# Altium integrated library Samtec 2 mm Pitch Terminal Strips.IntLib: 623 symbols (part 2 of 5) (continued)
## T2M-107-01-L-D-TH-WT (continued)
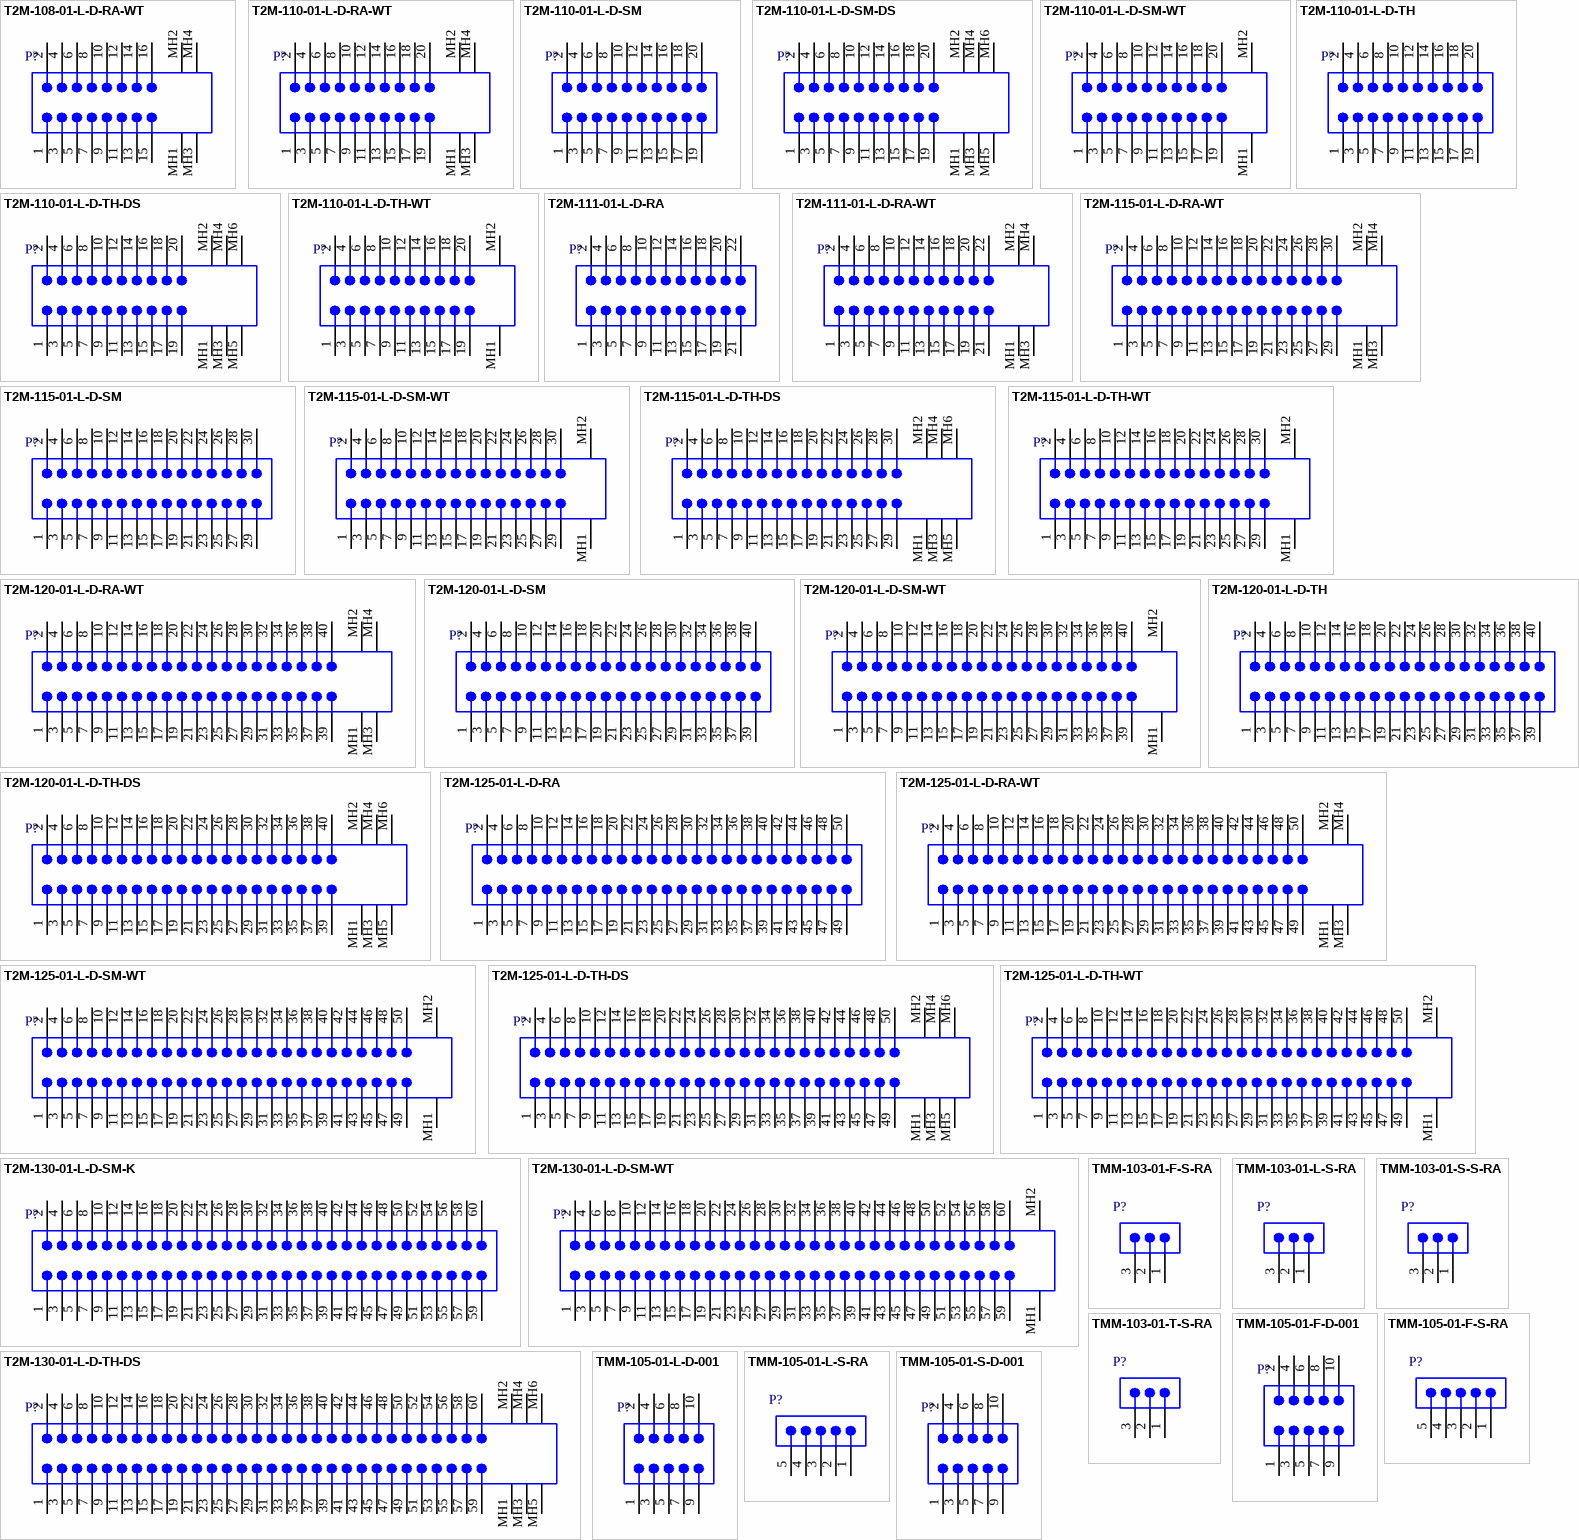
[diagram p5: symbols T2M-108-01-L-D-RA-WT to TMM-105-01-S-D-001]

## T2M-108-01-L-D-RA-WT
designator P?
High Reliability Cable Header, Through-hole, Right Angle, -55 to 125 degC, 2 mm Pitch, 16-Pin, Male, RoHS; Manufacturer: Samtec; PartNumber: T2M-108-01-L-D-RA-WT; Pitch: 2 mm; DatasheetVersion: F-214; PackageVersion: V, 3/2009; PackageReference: T2M-108-01-X-D-RA-WT; PackageDescription: 2mm Shrouded Terminal Strip; Orientation: Right Angle; RoHS: True; Temperature Range: -55 to 125 degC; Mounting Technology: Through-hole; ComponentLink1Description: Manufacturer URL; ComponentLink1URL: http://www.samtec.com; ComponentLink2Description: Datasheet; ComponentLink2URL: http://d2a072wq521u33.cloudfront.net/catalog_english//t2m.pdf; ComponentLink3Description: Package Specification; ComponentLink3URL: http://www.samtec.com/documents/webfiles/cpdf/T2M-1XX-XX-X-D-XX-XX-MKT.pdf
footprint SMTC-T2M-108-01-X-D-RA-WT (Shrouded Terminal Strip, 2x8 Pins, Right Angle, 2mm Pitch, Male)
pins: 1, 2, 3, 4, 5, 6, 7, 8, 9, 10, 11, 12, 13, 14, 15, 16, MH1, MH2, MH3, MH4

## T2M-110-01-L-D-RA-WT
designator P?
High Reliability Cable Header, Through-hole, Right Angle, -55 to 125 degC, 2 mm Pitch, 20-Pin, Male, RoHS; Manufacturer: Samtec; PartNumber: T2M-110-01-L-D-RA-WT; Pitch: 2 mm; DatasheetVersion: F-214; PackageVersion: V, 3/2009; PackageReference: T2M-110-01-X-D-RA-WT; PackageDescription: 2mm Shrouded Terminal Strip; Supplier 1: Newark; Supplier Part Number 1: 92T9484; Orientation: Right Angle; RoHS: True; Temperature Range: -55 to 125 degC; Mounting Technology: Through-hole; ComponentLink1Description: Manufacturer URL; ComponentLink1URL: http://www.samtec.com; ComponentLink2Description: Datasheet; ComponentLink2URL: http://d2a072wq521u33.cloudfront.net/catalog_english//t2m.pdf; ComponentLink3Description: Package Specification; ComponentLink3URL: http://www.samtec.com/documents/webfiles/cpdf/T2M-1XX-XX-X-D-XX-XX-MKT.pdf
footprint SMTC-T2M-110-01-X-D-RA-WT (Shrouded Terminal Strip, 2x10 Pins, Right Angle, 2mm Pitch, Male)
pins: 1, 2, 3, 4, 5, 6, 7, 8, 9, 10, 11, 12, 13, 14, 15, 16, 17, 18, 19, 20, MH1, MH2, MH3, MH4

## T2M-110-01-L-D-SM
designator P?
High Reliability Cable Header, Surface Mount, Vertical, -55 to 125 degC, 2 mm Pitch, 20-Pin, Male, RoHS; Manufacturer: Samtec; PartNumber: T2M-110-01-L-D-SM; Pitch: 2 mm; DatasheetVersion: F-214; PackageVersion: V, 3/2009; PackageReference: T2M-110-01-X-D-SM; PackageDescription: 2mm Shrouded Terminal Strip; Orientation: Vertical; RoHS: True; Temperature Range: -55 to 125 degC; Mounting Technology: Surface Mount; ComponentLink1Description: Manufacturer URL; ComponentLink1URL: http://www.samtec.com; ComponentLink2Description: Datasheet; ComponentLink2URL: http://d2a072wq521u33.cloudfront.net/catalog_english//t2m.pdf; ComponentLink3Description: Package Specification; ComponentLink3URL: http://www.samtec.com/documents/webfiles/cpdf/T2M-1XX-XX-X-D-XX-XX-MKT.pdf
footprint SMTC-T2M-110-01-X-D-SM (Shrouded Terminal Strip, 2x10 Pins, Vertical, 2mm Pitch, Male)
pins: 1, 2, 3, 4, 5, 6, 7, 8, 9, 10, 11, 12, 13, 14, 15, 16, 17, 18, 19, 20

## T2M-110-01-L-D-SM-DS
designator P?
High Reliability Cable Header, Vertical, -55 to 125 degC, 2 mm Pitch, 20-Pin, Male, RoHS; Manufacturer: Samtec; PartNumber: T2M-110-01-L-D-SM-DS; Pitch: 2 mm; DatasheetVersion: F-214; PackageVersion: V, 3/2009; PackageReference: T2M-110-01-X-D-SM-DS; PackageDescription: 2mm Shrouded Terminal Strip; Orientation: Vertical; RoHS: True; Temperature Range: -55 to 125 degC; ComponentLink1Description: Manufacturer URL; ComponentLink1URL: http://www.samtec.com; ComponentLink2Description: Datasheet; ComponentLink2URL: http://d2a072wq521u33.cloudfront.net/catalog_english//t2m.pdf; ComponentLink3Description: Package Specification; ComponentLink3URL: http://www.samtec.com/documents/webfiles/cpdf/T2M-1XX-XX-X-D-XX-XX-MKT.pdf
footprint SMTC-T2M-110-01-X-D-SM-DS (Shrouded Terminal Strip, 2x10 Pins, Vertical, 2mm Pitch, Male)
pins: 1, 2, 3, 4, 5, 6, 7, 8, 9, 10, 11, 12, 13, 14, 15, 16, 17, 18, 19, 20, MH1, MH2, MH3, MH4, MH5, MH6

## T2M-110-01-L-D-SM-WT
designator P?
High Reliability Cable Header, Vertical, -55 to 125 degC, 2 mm Pitch, 20-Pin, Male, RoHS; Manufacturer: Samtec; PartNumber: T2M-110-01-L-D-SM-WT; Pitch: 2 mm; DatasheetVersion: F-214; PackageVersion: V, 3/2009; PackageReference: T2M-110-01-X-D-SM-WT; PackageDescription: 2mm Shrouded Terminal Strip; Orientation: Vertical; RoHS: True; Temperature Range: -55 to 125 degC; ComponentLink1Description: Manufacturer URL; ComponentLink1URL: http://www.samtec.com; ComponentLink2Description: Datasheet; ComponentLink2URL: http://d2a072wq521u33.cloudfront.net/catalog_english//t2m.pdf; ComponentLink3Description: Package Specification; ComponentLink3URL: http://www.samtec.com/documents/webfiles/cpdf/T2M-1XX-XX-X-D-XX-XX-MKT.pdf
footprint SMTC-T2M-110-01-X-D-SM-WT (Shrouded Terminal Strip, 2x10 Pins, Vertical, 2mm Pitch, Male)
pins: 1, 2, 3, 4, 5, 6, 7, 8, 9, 10, 11, 12, 13, 14, 15, 16, 17, 18, 19, 20, MH1, MH2

## T2M-110-01-L-D-TH
designator P?
High Reliability Cable Header, Through-hole, Vertical, -55 to 125 degC, 2 mm Pitch, 20-Pin, Male, RoHS; Manufacturer: Samtec; PartNumber: T2M-110-01-L-D-TH; Pitch: 2 mm; DatasheetVersion: F-214; PackageVersion: V, 3/2009; PackageReference: T2M-110-01-X-D-TH; PackageDescription: 2mm Shrouded Terminal Strip; Orientation: Vertical; RoHS: True; Temperature Range: -55 to 125 degC; Mounting Technology: Through-hole; ComponentLink1Description: Manufacturer URL; ComponentLink1URL: http://www.samtec.com; ComponentLink2Description: Datasheet; ComponentLink2URL: http://d2a072wq521u33.cloudfront.net/catalog_english//t2m.pdf; ComponentLink3Description: Package Specification; ComponentLink3URL: http://www.samtec.com/documents/webfiles/cpdf/T2M-1XX-XX-X-D-XX-XX-MKT.pdf
footprint SMTC-T2M-110-01-X-D-TH (Shrouded Terminal Strip, 2x10 Pins, Vertical, 2mm Pitch, Male)
pins: 1, 2, 3, 4, 5, 6, 7, 8, 9, 10, 11, 12, 13, 14, 15, 16, 17, 18, 19, 20

## T2M-110-01-L-D-TH-DS
designator P?
High Reliability Cable Header, Through-hole, Vertical, -55 to 125 degC, 2 mm Pitch, 20-Pin, Male, RoHS; Manufacturer: Samtec; PartNumber: T2M-110-01-L-D-TH-DS; Pitch: 2 mm; DatasheetVersion: F-214; PackageVersion: V, 3/2009; PackageReference: T2M-110-01-X-D-TH-DS; PackageDescription: 2mm Shrouded Terminal Strip; Orientation: Vertical; RoHS: True; Temperature Range: -55 to 125 degC; Mounting Technology: Through-hole; ComponentLink1Description: Manufacturer URL; ComponentLink1URL: http://www.samtec.com; ComponentLink2Description: Datasheet; ComponentLink2URL: http://d2a072wq521u33.cloudfront.net/catalog_english//t2m.pdf; ComponentLink3Description: Package Specification; ComponentLink3URL: http://www.samtec.com/documents/webfiles/cpdf/T2M-1XX-XX-X-D-XX-XX-MKT.pdf
footprint SMTC-T2M-110-01-X-D-TH-DS (Shrouded Terminal Strip, 2x10 Pins, Vertical, 2mm Pitch, Male)
pins: 1, 2, 3, 4, 5, 6, 7, 8, 9, 10, 11, 12, 13, 14, 15, 16, 17, 18, 19, 20, MH1, MH2, MH3, MH4, MH5, MH6

## T2M-110-01-L-D-TH-WT
designator P?
High Reliability Cable Header, Through-hole, Vertical, -55 to 125 degC, 2 mm Pitch, 20-Pin, Male, RoHS; Manufacturer: Samtec; PartNumber: T2M-110-01-L-D-TH-WT; Pitch: 2 mm; DatasheetVersion: F-214; PackageVersion: V, 3/2009; PackageReference: T2M-110-01-X-D-TH-WT; PackageDescription: 2mm Shrouded Terminal Strip; Orientation: Vertical; RoHS: True; Temperature Range: -55 to 125 degC; Mounting Technology: Through-hole; ComponentLink1Description: Manufacturer URL; ComponentLink1URL: http://www.samtec.com; ComponentLink2Description: Datasheet; ComponentLink2URL: http://d2a072wq521u33.cloudfront.net/catalog_english//t2m.pdf; ComponentLink3Description: Package Specification; ComponentLink3URL: http://www.samtec.com/documents/webfiles/cpdf/T2M-1XX-XX-X-D-XX-XX-MKT.pdf
footprint SMTC-T2M-110-01-X-D-TH-WT (Shrouded Terminal Strip, 2x10 Pins, Vertical, 2mm Pitch, Male)
pins: 1, 2, 3, 4, 5, 6, 7, 8, 9, 10, 11, 12, 13, 14, 15, 16, 17, 18, 19, 20, MH1, MH2

## T2M-111-01-L-D-RA
designator P?
High Reliability Cable Header, Through-hole, Right Angle, -55 to 125 degC, 2 mm Pitch, 22-Pin, Male, RoHS; Manufacturer: Samtec; PartNumber: T2M-111-01-L-D-RA; Pitch: 2 mm; DatasheetVersion: F-214; PackageVersion: V, 3/2009; PackageReference: T2M-111-01-X-D-RA; PackageDescription: 2mm Shrouded Terminal Strip; Orientation: Right Angle; RoHS: True; Temperature Range: -55 to 125 degC; Mounting Technology: Through-hole; ComponentLink1Description: Manufacturer URL; ComponentLink1URL: http://www.samtec.com; ComponentLink2Description: Datasheet; ComponentLink2URL: http://d2a072wq521u33.cloudfront.net/catalog_english//t2m.pdf; ComponentLink3Description: Package Specification; ComponentLink3URL: http://www.samtec.com/documents/webfiles/cpdf/T2M-1XX-XX-X-D-XX-XX-MKT.pdf
footprint SMTC-T2M-111-01-X-D-RA (Shrouded Terminal Strip, 2x11 Pins, Right Angle, 2mm Pitch, Male)
pins: 1, 2, 3, 4, 5, 6, 7, 8, 9, 10, 11, 12, 13, 14, 15, 16, 17, 18, 19, 20, 21, 22

## T2M-111-01-L-D-RA-WT
designator P?
High Reliability Cable Header, Through-hole, Right Angle, -55 to 125 degC, 2 mm Pitch, 22-Pin, Male, RoHS; Manufacturer: Samtec; PartNumber: T2M-111-01-L-D-RA-WT; Pitch: 2 mm; DatasheetVersion: F-214; PackageVersion: V, 3/2009; PackageReference: T2M-111-01-X-D-RA-WT; PackageDescription: 2mm Shrouded Terminal Strip; Orientation: Right Angle; RoHS: True; Temperature Range: -55 to 125 degC; Mounting Technology: Through-hole; ComponentLink1Description: Manufacturer URL; ComponentLink1URL: http://www.samtec.com; ComponentLink2Description: Datasheet; ComponentLink2URL: http://d2a072wq521u33.cloudfront.net/catalog_english//t2m.pdf; ComponentLink3Description: Package Specification; ComponentLink3URL: http://www.samtec.com/documents/webfiles/cpdf/T2M-1XX-XX-X-D-XX-XX-MKT.pdf
footprint SMTC-T2M-111-01-X-D-RA-WT (Shrouded Terminal Strip, 2x11 Pins, Right Angle, 2mm Pitch, Male)
pins: 1, 2, 3, 4, 5, 6, 7, 8, 9, 10, 11, 12, 13, 14, 15, 16, 17, 18, 19, 20, 21, 22, MH1, MH2, MH3, MH4

## T2M-115-01-L-D-RA-WT
designator P?
High Reliability Cable Header, Through-hole, Right Angle, -55 to 125 degC, 2 mm Pitch, 30-Pin, Male, RoHS; Manufacturer: Samtec; PartNumber: T2M-115-01-L-D-RA-WT; Pitch: 2 mm; DatasheetVersion: F-214; PackageVersion: V, 3/2009; PackageReference: T2M-115-01-X-D-RA-WT; PackageDescription: 2mm Shrouded Terminal Strip; Supplier 1: Newark; Supplier Part Number 1: 28T0618; Orientation: Right Angle; RoHS: True; Temperature Range: -55 to 125 degC; Mounting Technology: Through-hole; ComponentLink1Description: Manufacturer URL; ComponentLink1URL: http://www.samtec.com; ComponentLink2Description: Datasheet; ComponentLink2URL: http://d2a072wq521u33.cloudfront.net/catalog_english//t2m.pdf; ComponentLink3Description: Package Specification; ComponentLink3URL: http://www.samtec.com/documents/webfiles/cpdf/T2M-1XX-XX-X-D-XX-XX-MKT.pdf
footprint SMTC-T2M-115-01-X-D-RA-WT (Shrouded Terminal Strip, 2x15 Pins, Right Angle, 2mm Pitch, Male)
pins: 1, 2, 3, 4, 5, 6, 7, 8, 9, 10, 11, 12, 13, 14, 15, 16, 17, 18, 19, 20, 21, 22, 23, 24, 25, 26, 27, 28, 29, 30, MH1, MH2, MH3, MH4

## T2M-115-01-L-D-SM
designator P?
High Reliability Cable Header, Surface Mount, Vertical, -55 to 125 degC, 2 mm Pitch, 30-Pin, Male, RoHS; Manufacturer: Samtec; PartNumber: T2M-115-01-L-D-SM; Pitch: 2 mm; DatasheetVersion: F-214; PackageVersion: V, 3/2009; PackageReference: T2M-115-01-X-D-SM; PackageDescription: 2mm Shrouded Terminal Strip; Orientation: Vertical; RoHS: True; Temperature Range: -55 to 125 degC; Mounting Technology: Surface Mount; ComponentLink1Description: Manufacturer URL; ComponentLink1URL: http://www.samtec.com; ComponentLink2Description: Datasheet; ComponentLink2URL: http://d2a072wq521u33.cloudfront.net/catalog_english//t2m.pdf; ComponentLink3Description: Package Specification; ComponentLink3URL: http://www.samtec.com/documents/webfiles/cpdf/T2M-1XX-XX-X-D-XX-XX-MKT.pdf
footprint SMTC-T2M-115-01-X-D-SM (Shrouded Terminal Strip, 2x15 Pins, Vertical, 2mm Pitch, Male)
pins: 1, 2, 3, 4, 5, 6, 7, 8, 9, 10, 11, 12, 13, 14, 15, 16, 17, 18, 19, 20, 21, 22, 23, 24, 25, 26, 27, 28, 29, 30

## T2M-115-01-L-D-SM-WT
designator P?
High Reliability Cable Header, Vertical, -55 to 125 degC, 2 mm Pitch, 30-Pin, Male, RoHS; Manufacturer: Samtec; PartNumber: T2M-115-01-L-D-SM-WT; Pitch: 2 mm; DatasheetVersion: F-214; PackageVersion: V, 3/2009; PackageReference: T2M-115-01-X-D-SM-WT; PackageDescription: 2mm Shrouded Terminal Strip; Orientation: Vertical; RoHS: True; Temperature Range: -55 to 125 degC; ComponentLink1Description: Manufacturer URL; ComponentLink1URL: http://www.samtec.com; ComponentLink2Description: Datasheet; ComponentLink2URL: http://d2a072wq521u33.cloudfront.net/catalog_english//t2m.pdf; ComponentLink3Description: Package Specification; ComponentLink3URL: http://www.samtec.com/documents/webfiles/cpdf/T2M-1XX-XX-X-D-XX-XX-MKT.pdf
footprint SMTC-T2M-115-01-X-D-SM-WT (Shrouded Terminal Strip, 2x15 Pins, Vertical, 2mm Pitch, Male)
pins: 1, 2, 3, 4, 5, 6, 7, 8, 9, 10, 11, 12, 13, 14, 15, 16, 17, 18, 19, 20, 21, 22, 23, 24, 25, 26, 27, 28, 29, 30, MH1, MH2

## T2M-115-01-L-D-TH-DS
designator P?
High Reliability Cable Header, Through-hole, Vertical, -55 to 125 degC, 2 mm Pitch, 30-Pin, Male, RoHS; Manufacturer: Samtec; PartNumber: T2M-115-01-L-D-TH-DS; Pitch: 2 mm; DatasheetVersion: F-214; PackageVersion: V, 3/2009; PackageReference: T2M-115-01-X-D-TH-DS; PackageDescription: 2mm Shrouded Terminal Strip; Orientation: Vertical; RoHS: True; Temperature Range: -55 to 125 degC; Mounting Technology: Through-hole; ComponentLink1Description: Manufacturer URL; ComponentLink1URL: http://www.samtec.com; ComponentLink2Description: Datasheet; ComponentLink2URL: http://d2a072wq521u33.cloudfront.net/catalog_english//t2m.pdf; ComponentLink3Description: Package Specification; ComponentLink3URL: http://www.samtec.com/documents/webfiles/cpdf/T2M-1XX-XX-X-D-XX-XX-MKT.pdf
footprint SMTC-T2M-115-01-X-D-TH-DS (Shrouded Terminal Strip, 2x15 Pins, Vertical, 2mm Pitch, Male)
pins: 1, 2, 3, 4, 5, 6, 7, 8, 9, 10, 11, 12, 13, 14, 15, 16, 17, 18, 19, 20, 21, 22, 23, 24, 25, 26, 27, 28, 29, 30, MH1, MH2, MH3, MH4, MH5, MH6

## T2M-115-01-L-D-TH-WT
designator P?
High Reliability Cable Header, Through-hole, Vertical, -55 to 125 degC, 2 mm Pitch, 30-Pin, Male, RoHS; Manufacturer: Samtec; PartNumber: T2M-115-01-L-D-TH-WT; Pitch: 2 mm; DatasheetVersion: F-214; PackageVersion: V, 3/2009; PackageReference: T2M-115-01-X-D-TH-WT; PackageDescription: 2mm Shrouded Terminal Strip; Orientation: Vertical; RoHS: True; Temperature Range: -55 to 125 degC; Mounting Technology: Through-hole; ComponentLink1Description: Manufacturer URL; ComponentLink1URL: http://www.samtec.com; ComponentLink2Description: Datasheet; ComponentLink2URL: http://d2a072wq521u33.cloudfront.net/catalog_english//t2m.pdf; ComponentLink3Description: Package Specification; ComponentLink3URL: http://www.samtec.com/documents/webfiles/cpdf/T2M-1XX-XX-X-D-XX-XX-MKT.pdf
footprint SMTC-T2M-115-01-X-D-TH-WT (Shrouded Terminal Strip, 2x15 Pins, Vertical, 2mm Pitch, Male)
pins: 1, 2, 3, 4, 5, 6, 7, 8, 9, 10, 11, 12, 13, 14, 15, 16, 17, 18, 19, 20, 21, 22, 23, 24, 25, 26, 27, 28, 29, 30, MH1, MH2

## T2M-120-01-L-D-RA-WT
designator P?
High Reliability Cable Header, Through-hole, Right Angle, -55 to 125 degC, 2 mm Pitch, 40-Pin, Male, RoHS; Manufacturer: Samtec; PartNumber: T2M-120-01-L-D-RA-WT; Pitch: 2 mm; DatasheetVersion: F-214; PackageVersion: V, 3/2009; PackageReference: T2M-120-01-X-D-RA-WT; PackageDescription: 2mm Shrouded Terminal Strip; Orientation: Right Angle; RoHS: True; Temperature Range: -55 to 125 degC; Mounting Technology: Through-hole; ComponentLink1Description: Manufacturer URL; ComponentLink1URL: http://www.samtec.com; ComponentLink2Description: Datasheet; ComponentLink2URL: http://d2a072wq521u33.cloudfront.net/catalog_english//t2m.pdf; ComponentLink3Description: Package Specification; ComponentLink3URL: http://www.samtec.com/documents/webfiles/cpdf/T2M-1XX-XX-X-D-XX-XX-MKT.pdf
footprint SMTC-T2M-120-01-X-D-RA-WT (Shrouded Terminal Strip, 2x20 Pins, Right Angle, 2mm Pitch, Male)
pins: 1, 2, 3, 4, 5, 6, 7, 8, 9, 10, 11, 12, 13, 14, 15, 16, 17, 18, 19, 20, 21, 22, 23, 24, 25, 26, 27, 28, 29, 30, 31, 32, 33, 34, 35, 36, 37, 38, 39, 40, MH1, MH2, MH3, MH4

## T2M-120-01-L-D-SM
designator P?
High Reliability Cable Header, Surface Mount, Vertical, -55 to 125 degC, 2 mm Pitch, 40-Pin, Male, RoHS; Manufacturer: Samtec; PartNumber: T2M-120-01-L-D-SM; Pitch: 2 mm; DatasheetVersion: F-214; PackageVersion: V, 3/2009; PackageReference: T2M-120-01-X-D-SM; PackageDescription: 2mm Shrouded Terminal Strip; Orientation: Vertical; RoHS: True; Temperature Range: -55 to 125 degC; Mounting Technology: Surface Mount; ComponentLink1Description: Manufacturer URL; ComponentLink1URL: http://www.samtec.com; ComponentLink2Description: Datasheet; ComponentLink2URL: http://d2a072wq521u33.cloudfront.net/catalog_english//t2m.pdf; ComponentLink3Description: Package Specification; ComponentLink3URL: http://www.samtec.com/documents/webfiles/cpdf/T2M-1XX-XX-X-D-XX-XX-MKT.pdf
footprint SMTC-T2M-120-01-X-D-SM (Shrouded Terminal Strip, 2x20 Pins, Vertical, 2mm Pitch, Male)
pins: 1, 2, 3, 4, 5, 6, 7, 8, 9, 10, 11, 12, 13, 14, 15, 16, 17, 18, 19, 20, 21, 22, 23, 24, 25, 26, 27, 28, 29, 30, 31, 32, 33, 34, 35, 36, 37, 38, 39, 40

## T2M-120-01-L-D-SM-WT
designator P?
High Reliability Cable Header, Vertical, -55 to 125 degC, 2 mm Pitch, 40-Pin, Male, RoHS; Manufacturer: Samtec; PartNumber: T2M-120-01-L-D-SM-WT; Pitch: 2 mm; DatasheetVersion: F-214; PackageVersion: V, 3/2009; PackageReference: T2M-120-01-X-D-SM-WT; PackageDescription: 2mm Shrouded Terminal Strip; Supplier 1: Newark; Supplier Part Number 1: 43T4685; Orientation: Vertical; RoHS: True; Temperature Range: -55 to 125 degC; ComponentLink1Description: Manufacturer URL; ComponentLink1URL: http://www.samtec.com; ComponentLink2Description: Datasheet; ComponentLink2URL: http://d2a072wq521u33.cloudfront.net/catalog_english//t2m.pdf; ComponentLink3Description: Package Specification; ComponentLink3URL: http://www.samtec.com/documents/webfiles/cpdf/T2M-1XX-XX-X-D-XX-XX-MKT.pdf
footprint SMTC-T2M-120-01-X-D-SM-WT (Shrouded Terminal Strip, 2x20 Pins, Vertical, 2mm Pitch, Male)
pins: 1, 2, 3, 4, 5, 6, 7, 8, 9, 10, 11, 12, 13, 14, 15, 16, 17, 18, 19, 20, 21, 22, 23, 24, 25, 26, 27, 28, 29, 30, 31, 32, 33, 34, 35, 36, 37, 38, 39, 40, MH1, MH2

## T2M-120-01-L-D-TH
designator P?
High Reliability Cable Header, Through-hole, Vertical, -55 to 125 degC, 2 mm Pitch, 40-Pin, Male, RoHS; Manufacturer: Samtec; PartNumber: T2M-120-01-L-D-TH; Pitch: 2 mm; DatasheetVersion: F-214; PackageVersion: V, 3/2009; PackageReference: T2M-120-01-X-D-TH; PackageDescription: 2mm Shrouded Terminal Strip; Supplier 1: Newark; Supplier Part Number 1: 25T0499; Orientation: Vertical; RoHS: True; Temperature Range: -55 to 125 degC; Mounting Technology: Through-hole; ComponentLink1Description: Manufacturer URL; ComponentLink1URL: http://www.samtec.com; ComponentLink2Description: Datasheet; ComponentLink2URL: http://d2a072wq521u33.cloudfront.net/catalog_english//t2m.pdf; ComponentLink3Description: Package Specification; ComponentLink3URL: http://www.samtec.com/documents/webfiles/cpdf/T2M-1XX-XX-X-D-XX-XX-MKT.pdf
footprint SMTC-T2M-120-01-X-D-TH (Shrouded Terminal Strip, 2x20 Pins, Vertical, 2mm Pitch, Male)
pins: 1, 2, 3, 4, 5, 6, 7, 8, 9, 10, 11, 12, 13, 14, 15, 16, 17, 18, 19, 20, 21, 22, 23, 24, 25, 26, 27, 28, 29, 30, 31, 32, 33, 34, 35, 36, 37, 38, 39, 40

## T2M-120-01-L-D-TH-DS
designator P?
High Reliability Cable Header, Through-hole, Vertical, -55 to 125 degC, 2 mm Pitch, 40-Pin, Male, RoHS; Manufacturer: Samtec; PartNumber: T2M-120-01-L-D-TH-DS; Pitch: 2 mm; DatasheetVersion: F-214; PackageVersion: V, 3/2009; PackageReference: T2M-120-01-X-D-TH-DS; PackageDescription: 2mm Shrouded Terminal Strip; Orientation: Vertical; RoHS: True; Temperature Range: -55 to 125 degC; Mounting Technology: Through-hole; ComponentLink1Description: Manufacturer URL; ComponentLink1URL: http://www.samtec.com; ComponentLink2Description: Datasheet; ComponentLink2URL: http://d2a072wq521u33.cloudfront.net/catalog_english//t2m.pdf; ComponentLink3Description: Package Specification; ComponentLink3URL: http://www.samtec.com/documents/webfiles/cpdf/T2M-1XX-XX-X-D-XX-XX-MKT.pdf
footprint SMTC-T2M-120-01-X-D-TH-DS (Shrouded Terminal Strip, 2x20 Pins, Vertical, 2mm Pitch, Male)
pins: 1, 2, 3, 4, 5, 6, 7, 8, 9, 10, 11, 12, 13, 14, 15, 16, 17, 18, 19, 20, 21, 22, 23, 24, 25, 26, 27, 28, 29, 30, 31, 32, 33, 34, 35, 36, 37, 38, 39, 40, MH1, MH2, MH3, MH4, MH5, MH6

## T2M-125-01-L-D-RA
designator P?
High Reliability Cable Header, Through-hole, Right Angle, -55 to 125 degC, 2 mm Pitch, 50-Pin, Male, RoHS; Manufacturer: Samtec; PartNumber: T2M-125-01-L-D-RA; Pitch: 2 mm; DatasheetVersion: F-214; PackageVersion: V, 3/2009; PackageReference: T2M-125-01-X-D-RA; PackageDescription: 2mm Shrouded Terminal Strip; Orientation: Right Angle; RoHS: True; Temperature Range: -55 to 125 degC; Mounting Technology: Through-hole; ComponentLink1Description: Manufacturer URL; ComponentLink1URL: http://www.samtec.com; ComponentLink2Description: Datasheet; ComponentLink2URL: http://d2a072wq521u33.cloudfront.net/catalog_english//t2m.pdf; ComponentLink3Description: Package Specification; ComponentLink3URL: http://www.samtec.com/documents/webfiles/cpdf/T2M-1XX-XX-X-D-XX-XX-MKT.pdf
footprint SMTC-T2M-125-01-X-D-RA (Shrouded Terminal Strip, 2x25 Pins, Right Angle, 2mm Pitch, Male)
pins: 1, 2, 3, 4, 5, 6, 7, 8, 9, 10, 11, 12, 13, 14, 15, 16, 17, 18, 19, 20, 21, 22, 23, 24, 25, 26, 27, 28, 29, 30, 31, 32, 33, 34, 35, 36, 37, 38, 39, 40, 41, 42, 43, 44, 45, 46, 47, 48, 49, 50

## T2M-125-01-L-D-RA-WT
designator P?
High Reliability Cable Header, Through-hole, Right Angle, -55 to 125 degC, 2 mm Pitch, 50-Pin, Male, RoHS; Manufacturer: Samtec; PartNumber: T2M-125-01-L-D-RA-WT; Pitch: 2 mm; DatasheetVersion: F-214; PackageVersion: V, 3/2009; PackageReference: T2M-125-01-X-D-RA-WT; PackageDescription: 2mm Shrouded Terminal Strip; Orientation: Right Angle; RoHS: True; Temperature Range: -55 to 125 degC; Mounting Technology: Through-hole; ComponentLink1Description: Manufacturer URL; ComponentLink1URL: http://www.samtec.com; ComponentLink2Description: Datasheet; ComponentLink2URL: http://d2a072wq521u33.cloudfront.net/catalog_english//t2m.pdf; ComponentLink3Description: Package Specification; ComponentLink3URL: http://www.samtec.com/documents/webfiles/cpdf/T2M-1XX-XX-X-D-XX-XX-MKT.pdf
footprint SMTC-T2M-125-01-X-D-RA-WT (Shrouded Terminal Strip, 2x25 Pins, Right Angle, 2mm Pitch, Male)
pins: 1, 2, 3, 4, 5, 6, 7, 8, 9, 10, 11, 12, 13, 14, 15, 16, 17, 18, 19, 20, 21, 22, 23, 24, 25, 26, 27, 28, 29, 30, 31, 32, 33, 34, 35, 36, 37, 38, 39, 40, 41, 42, 43, 44, 45, 46, 47, 48, 49, 50, MH1, MH2, MH3, MH4

## T2M-125-01-L-D-SM-WT
designator P?
High Reliability Cable Header, Vertical, -55 to 125 degC, 2 mm Pitch, 50-Pin, Male, RoHS; Manufacturer: Samtec; PartNumber: T2M-125-01-L-D-SM-WT; Pitch: 2 mm; DatasheetVersion: F-214; PackageVersion: V, 3/2009; PackageReference: T2M-125-01-X-D-SM-WT; PackageDescription: 2mm Shrouded Terminal Strip; Supplier 1: Newark; Supplier Part Number 1: 44W5397; Orientation: Vertical; RoHS: True; Temperature Range: -55 to 125 degC; ComponentLink1Description: Manufacturer URL; ComponentLink1URL: http://www.samtec.com; ComponentLink2Description: Datasheet; ComponentLink2URL: http://d2a072wq521u33.cloudfront.net/catalog_english//t2m.pdf; ComponentLink3Description: Package Specification; ComponentLink3URL: http://www.samtec.com/documents/webfiles/cpdf/T2M-1XX-XX-X-D-XX-XX-MKT.pdf
footprint SMTC-T2M-125-01-X-D-SM-WT (Shrouded Terminal Strip, 2x25 Pins, Vertical, 2mm Pitch, Male)
pins: 1, 2, 3, 4, 5, 6, 7, 8, 9, 10, 11, 12, 13, 14, 15, 16, 17, 18, 19, 20, 21, 22, 23, 24, 25, 26, 27, 28, 29, 30, 31, 32, 33, 34, 35, 36, 37, 38, 39, 40, 41, 42, 43, 44, 45, 46, 47, 48, 49, 50, MH1, MH2

## T2M-125-01-L-D-TH-DS
designator P?
High Reliability Cable Header, Through-hole, Vertical, -55 to 125 degC, 2 mm Pitch, 50-Pin, Male, RoHS; Manufacturer: Samtec; PartNumber: T2M-125-01-L-D-TH-DS; Pitch: 2 mm; DatasheetVersion: F-214; PackageVersion: V, 3/2009; PackageReference: T2M-125-01-X-D-TH-DS; PackageDescription: 2mm Shrouded Terminal Strip; Orientation: Vertical; RoHS: True; Temperature Range: -55 to 125 degC; Mounting Technology: Through-hole; ComponentLink1Description: Manufacturer URL; ComponentLink1URL: http://www.samtec.com; ComponentLink2Description: Datasheet; ComponentLink2URL: http://d2a072wq521u33.cloudfront.net/catalog_english//t2m.pdf; ComponentLink3Description: Package Specification; ComponentLink3URL: http://www.samtec.com/documents/webfiles/cpdf/T2M-1XX-XX-X-D-XX-XX-MKT.pdf
footprint SMTC-T2M-125-01-X-D-TH-DS (Shrouded Terminal Strip, 2x25 Pins, Vertical, 2mm Pitch, Male)
pins: 1, 2, 3, 4, 5, 6, 7, 8, 9, 10, 11, 12, 13, 14, 15, 16, 17, 18, 19, 20, 21, 22, 23, 24, 25, 26, 27, 28, 29, 30, 31, 32, 33, 34, 35, 36, 37, 38, 39, 40, 41, 42, 43, 44, 45, 46, 47, 48, 49, 50, MH1, MH2, MH3, MH4, MH5, MH6

## T2M-125-01-L-D-TH-WT
designator P?
High Reliability Cable Header, Through-hole, Vertical, -55 to 125 degC, 2 mm Pitch, 50-Pin, Male, RoHS; Manufacturer: Samtec; PartNumber: T2M-125-01-L-D-TH-WT; Pitch: 2 mm; DatasheetVersion: F-214; PackageVersion: V, 3/2009; PackageReference: T2M-125-01-X-D-TH-WT; PackageDescription: 2mm Shrouded Terminal Strip; Orientation: Vertical; RoHS: True; Temperature Range: -55 to 125 degC; Mounting Technology: Through-hole; ComponentLink1Description: Manufacturer URL; ComponentLink1URL: http://www.samtec.com; ComponentLink2Description: Datasheet; ComponentLink2URL: http://d2a072wq521u33.cloudfront.net/catalog_english//t2m.pdf; ComponentLink3Description: Package Specification; ComponentLink3URL: http://www.samtec.com/documents/webfiles/cpdf/T2M-1XX-XX-X-D-XX-XX-MKT.pdf
footprint SMTC-T2M-125-01-X-D-TH-WT (Shrouded Terminal Strip, 2x25 Pins, Vertical, 2mm Pitch, Male)
pins: 1, 2, 3, 4, 5, 6, 7, 8, 9, 10, 11, 12, 13, 14, 15, 16, 17, 18, 19, 20, 21, 22, 23, 24, 25, 26, 27, 28, 29, 30, 31, 32, 33, 34, 35, 36, 37, 38, 39, 40, 41, 42, 43, 44, 45, 46, 47, 48, 49, 50, MH1, MH2

## T2M-130-01-L-D-SM-K
designator P?
High Reliability Cable Header, Surface Mount, Vertical, -55 to 125 degC, 2 mm Pitch, 60-Pin, Male, RoHS; Manufacturer: Samtec; PartNumber: T2M-130-01-L-D-SM-K; Pitch: 2 mm; DatasheetVersion: F-214; PackageVersion: V, 3/2009; PackageReference: T2M-130-01-X-D-SM-K; PackageDescription: 2mm Shrouded Terminal Strip; Orientation: Vertical; RoHS: True; Temperature Range: -55 to 125 degC; Mounting Technology: Surface Mount; ComponentLink1Description: Manufacturer URL; ComponentLink1URL: http://www.samtec.com; ComponentLink2Description: Datasheet; ComponentLink2URL: http://d2a072wq521u33.cloudfront.net/catalog_english//t2m.pdf; ComponentLink3Description: Package Specification; ComponentLink3URL: http://www.samtec.com/documents/webfiles/cpdf/T2M-1XX-XX-X-D-XX-XX-MKT.pdf
footprint SMTC-T2M-130-01-X-D-SM-K (Shrouded Terminal Strip, 2x30 Pins, Vertical, 2mm Pitch, Male)
pins: 1, 2, 3, 4, 5, 6, 7, 8, 9, 10, 11, 12, 13, 14, 15, 16, 17, 18, 19, 20, 21, 22, 23, 24, 25, 26, 27, 28, 29, 30, 31, 32, 33, 34, 35, 36, 37, 38, 39, 40, 41, 42, 43, 44, 45, 46, 47, 48, 49, 50, 51, 52, 53, 54, 55, 56, 57, 58, 59, 60

## T2M-130-01-L-D-SM-WT
designator P?
High Reliability Cable Header, Vertical, -55 to 125 degC, 2 mm Pitch, 60-Pin, Male, RoHS; Manufacturer: Samtec; PartNumber: T2M-130-01-L-D-SM-WT; Pitch: 2 mm; DatasheetVersion: F-214; PackageVersion: V, 3/2009; PackageReference: T2M-130-01-X-D-SM-WT; PackageDescription: 2mm Shrouded Terminal Strip; Orientation: Vertical; RoHS: True; Temperature Range: -55 to 125 degC; ComponentLink1Description: Manufacturer URL; ComponentLink1URL: http://www.samtec.com; ComponentLink2Description: Datasheet; ComponentLink2URL: http://d2a072wq521u33.cloudfront.net/catalog_english//t2m.pdf; ComponentLink3Description: Package Specification; ComponentLink3URL: http://www.samtec.com/documents/webfiles/cpdf/T2M-1XX-XX-X-D-XX-XX-MKT.pdf
footprint SMTC-T2M-130-01-X-D-SM-WT (Shrouded Terminal Strip, 2x30 Pins, Vertical, 2mm Pitch, Male)
pins: 1, 2, 3, 4, 5, 6, 7, 8, 9, 10, 11, 12, 13, 14, 15, 16, 17, 18, 19, 20, 21, 22, 23, 24, 25, 26, 27, 28, 29, 30, 31, 32, 33, 34, 35, 36, 37, 38, 39, 40, 41, 42, 43, 44, 45, 46, 47, 48, 49, 50, 51, 52, 53, 54, 55, 56, 57, 58, 59, 60, MH1, MH2

## T2M-130-01-L-D-TH-DS
designator P?
High Reliability Cable Header, Through-hole, Vertical, -55 to 125 degC, 2 mm Pitch, 60-Pin, Male, RoHS; Manufacturer: Samtec; PartNumber: T2M-130-01-L-D-TH-DS; Pitch: 2 mm; DatasheetVersion: F-214; PackageVersion: V, 3/2009; PackageReference: T2M-130-01-X-D-TH-DS; PackageDescription: 2mm Shrouded Terminal Strip; Orientation: Vertical; RoHS: True; Temperature Range: -55 to 125 degC; Mounting Technology: Through-hole; ComponentLink1Description: Manufacturer URL; ComponentLink1URL: http://www.samtec.com; ComponentLink2Description: Datasheet; ComponentLink2URL: http://d2a072wq521u33.cloudfront.net/catalog_english//t2m.pdf; ComponentLink3Description: Package Specification; ComponentLink3URL: http://www.samtec.com/documents/webfiles/cpdf/T2M-1XX-XX-X-D-XX-XX-MKT.pdf
footprint SMTC-T2M-130-01-X-D-TH-DS (Shrouded Terminal Strip, 2x30 Pins, Vertical, 2mm Pitch, Male)
pins: 1, 2, 3, 4, 5, 6, 7, 8, 9, 10, 11, 12, 13, 14, 15, 16, 17, 18, 19, 20, 21, 22, 23, 24, 25, 26, 27, 28, 29, 30, 31, 32, 33, 34, 35, 36, 37, 38, 39, 40, 41, 42, 43, 44, 45, 46, 47, 48, 49, 50, 51, 52, 53, 54, 55, 56, 57, 58, 59, 60, MH1, MH2, MH3, MH4, MH5, MH6

## TMM-103-01-F-S-RA
designator P?
Low Profile Through-Hole Header, Right Angle, -55 to 125 degC, 2 mm Pitch, 3-Pin, Male, RoHS; Manufacturer: Samtec; PartNumber: TMM-103-01-F-S-RA; Pitch: 2 mm; DatasheetVersion: F-214; PackageVersion: V, 3/2013; PackageReference: TMM-103-01-X-S-RA; PackageDescription: 2 mm Terminal Strip Assembly (R/A); Orientation: Right Angle; RoHS: True; Temperature Range: -55 to 125 degC; Mounting Technology: Through-hole; ComponentLink1Description: Manufacturer URL; ComponentLink1URL: http://www.samtec.com; ComponentLink2Description: Datasheet; ComponentLink2URL: http://d2a072wq521u33.cloudfront.net/catalog_english//TMM_TH.PDF; ComponentLink3Description: Package Specification; ComponentLink3URL: http://www.samtec.com/documents/webfiles/cpdf/TMM-1XX-XX-XX-X-RA-XXX-MKT.pdf
footprint SMTC-TMM-103-01-X-S-RA (Terminal Strip Assembly, 1x3 Pins, Right Angle, 2mm Pitch, Male)
pins: 1, 2, 3

## TMM-103-01-L-S-RA
designator P?
Low Profile Through-Hole Header, Right Angle, -55 to 125 degC, 2 mm Pitch, 3-Pin, Male, RoHS; Manufacturer: Samtec; PartNumber: TMM-103-01-L-S-RA; Pitch: 2 mm; DatasheetVersion: F-214; PackageVersion: V, 3/2013; PackageReference: TMM-103-01-X-S-RA; PackageDescription: 2 mm Terminal Strip Assembly (R/A); Supplier 1: Newark; Supplier Part Number 1: 41P0587; Orientation: Right Angle; RoHS: True; Temperature Range: -55 to 125 degC; Mounting Technology: Through-hole; ComponentLink1Description: Manufacturer URL; ComponentLink1URL: http://www.samtec.com; ComponentLink2Description: Datasheet; ComponentLink2URL: http://d2a072wq521u33.cloudfront.net/catalog_english//TMM_TH.PDF; ComponentLink3Description: Package Specification; ComponentLink3URL: http://www.samtec.com/documents/webfiles/cpdf/TMM-1XX-XX-XX-X-RA-XXX-MKT.pdf
footprint SMTC-TMM-103-01-X-S-RA (Terminal Strip Assembly, 1x3 Pins, Right Angle, 2mm Pitch, Male)
pins: 1, 2, 3

## TMM-103-01-S-S-RA
designator P?
Low Profile Through-Hole Header, Right Angle, -55 to 125 degC, 2 mm Pitch, 3-Pin, Male, RoHS; Manufacturer: Samtec; PartNumber: TMM-103-01-S-S-RA; Pitch: 2 mm; DatasheetVersion: F-214; PackageVersion: V, 3/2013; PackageReference: TMM-103-01-X-S-RA; PackageDescription: 2 mm Terminal Strip Assembly (R/A); Orientation: Right Angle; RoHS: True; Temperature Range: -55 to 125 degC; Mounting Technology: Through-hole; ComponentLink1Description: Manufacturer URL; ComponentLink1URL: http://www.samtec.com; ComponentLink2Description: Datasheet; ComponentLink2URL: http://d2a072wq521u33.cloudfront.net/catalog_english//TMM_TH.PDF; ComponentLink3Description: Package Specification; ComponentLink3URL: http://www.samtec.com/documents/webfiles/cpdf/TMM-1XX-XX-XX-X-RA-XXX-MKT.pdf
footprint SMTC-TMM-103-01-X-S-RA (Terminal Strip Assembly, 1x3 Pins, Right Angle, 2mm Pitch, Male)
pins: 1, 2, 3
